# Altium schematic symbol library MiscPower.SchLib: 1552 symbols (part 12 of 22) (continued)
## LM5050MKX-2/NOPB (continued)
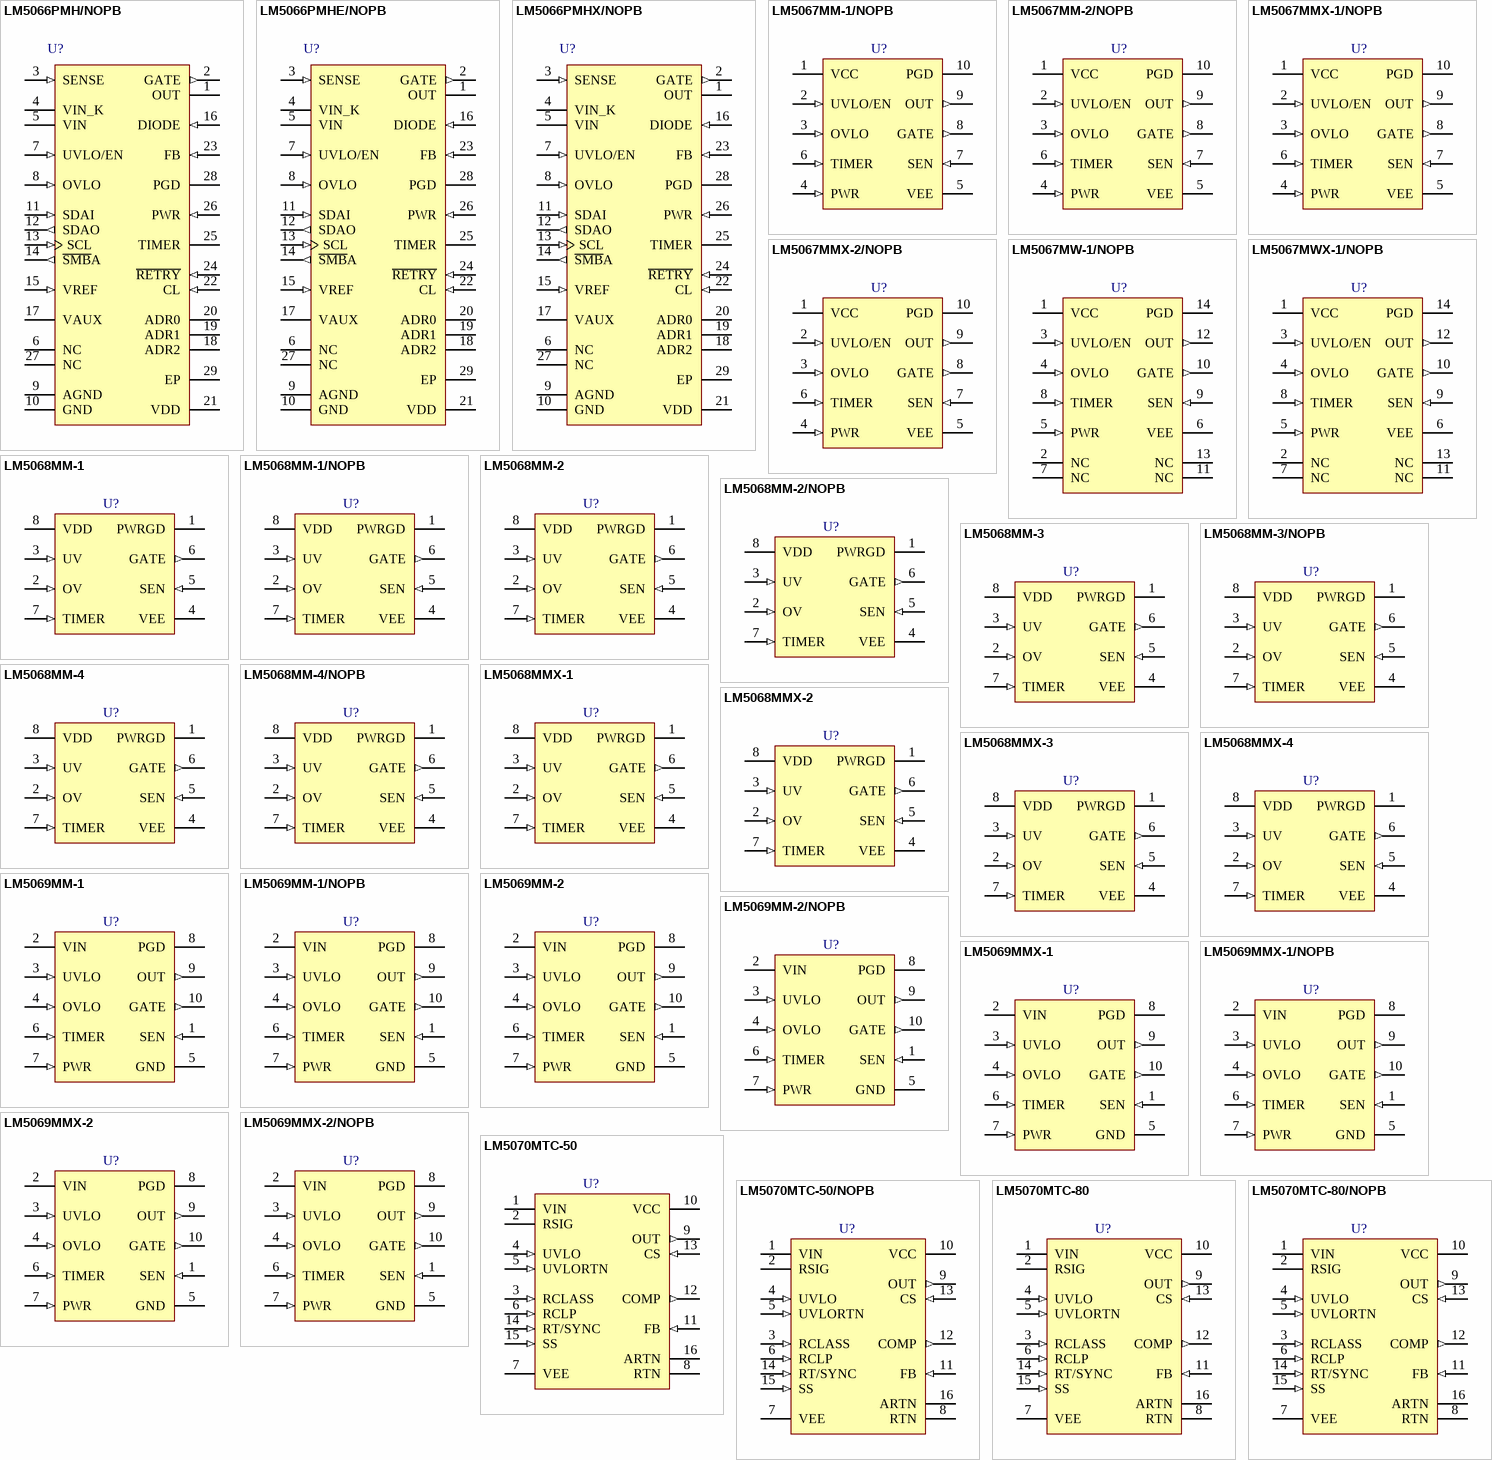
[diagram p27: symbols LM5066PMH/NOPB to LM5070MTC-80/NOPB]

## LM5066PMH/NOPB
designator U?
High Voltage System Power Management and Protection IC with PMBus, 28-pin TSSOP-EP, 48 Rail; PartNumber: LM5066PMH/NOPB; Manufacturer: National Semiconductor; PackageTopMarking: NSUZXYTTE#*LM5066PMH; PowerWise: Y; CompType: MiscPower; DatasheetVersion: Aug-2011; PackageVersion: revD, Oct-2003; PackageReference: MXA28A; PackageDescription: Molded TSSOP, Jedec, 9.7 x 4.4 x 0.9mm Body, 28 Lead, 0.65mm Pitch, Exposed Pad; RoHS: Y; PinCount: 28; High-Reliability: Y; Code_JEDEC: MO-153-AET; ComponentLink1Description: Manufacturer URL; ComponentLink1URL: http://www.national.com/; ComponentLink2Description: LM5066 Datasheet; ComponentLink2URL: http://www.national.com/ds/LM/LM5066.pdf; ComponentLink3Description: LM5066 Web Page; ComponentLink3URL: http://www.national.com/pf/LM/LM5066.html; ComponentLink4Description: MXA28A Package Page; ComponentLink4URL: http://www.national.com/packaging/folders/mxa28a.html
footprint MXA28A_N (TSOP, 28-Leads, Body 9.7x4.4mm, Pitch 0.65mm, Thermal Pad, IPC Medium Density)
footprint MXA28A_L (TSOP, 28-Leads, Body 9.7x4.4mm, Pitch 0.65mm, Thermal Pad, IPC High Density)
footprint MXA28A_M (TSOP, 28-Leads, Body 9.7x4.4mm, Pitch 0.65mm, Thermal Pad, IPC Low Density)
pins: 1 OUT (power), 2 GATE (out), 3 SENSE (in), 4 VIN_K (power), 5 VIN (power), 6 NC, 7 UVLO/EN (in), 8 OVLO (in), 9 AGND (power), 10 GND (power), 11 SDAI (in), 12 SDAO (out), 13 SCL (in), 14 ~{SMB}A (out), 15 VREF (in), 16 DIODE (in), 17 VAUX (power), 18 ADR2, 19 ADR1, 20 ADR0, 21 VDD (power), 22 CL (in), 23 FB (in), 24 ~{RETRY} (in), 25 TIMER, 26 PWR (in), 27 NC, 28 PGD (hiz), 29 EP (power)

## LM5066PMHE/NOPB
designator U?
High Voltage System Power Management and Protection IC with PMBus, 28-pin TSSOP-EP, 250 Reel; PartNumber: LM5066PMHE/NOPB; Manufacturer: National Semiconductor; PackageTopMarking: NSUZXYTTE#*LM5066PMH; PowerWise: Y; CompType: MiscPower; DatasheetVersion: Aug-2011; PackageVersion: revD, Oct-2003; PackageReference: MXA28A; PackageDescription: Molded TSSOP, Jedec, 9.7 x 4.4 x 0.9mm Body, 28 Lead, 0.65mm Pitch, Exposed Pad; RoHS: Y; PinCount: 28; High-Reliability: Y; Code_JEDEC: MO-153-AET; ComponentLink1Description: Manufacturer URL; ComponentLink1URL: http://www.national.com/; ComponentLink2Description: LM5066 Datasheet; ComponentLink2URL: http://www.national.com/ds/LM/LM5066.pdf; ComponentLink3Description: LM5066 Web Page; ComponentLink3URL: http://www.national.com/pf/LM/LM5066.html; ComponentLink4Description: MXA28A Package Page; ComponentLink4URL: http://www.national.com/packaging/folders/mxa28a.html
footprint MXA28A_N (TSOP, 28-Leads, Body 9.7x4.4mm, Pitch 0.65mm, Thermal Pad, IPC Medium Density)
footprint MXA28A_L (TSOP, 28-Leads, Body 9.7x4.4mm, Pitch 0.65mm, Thermal Pad, IPC High Density)
footprint MXA28A_M (TSOP, 28-Leads, Body 9.7x4.4mm, Pitch 0.65mm, Thermal Pad, IPC Low Density)
pins: 1 OUT (power), 2 GATE (out), 3 SENSE (in), 4 VIN_K (power), 5 VIN (power), 6 NC, 7 UVLO/EN (in), 8 OVLO (in), 9 AGND (power), 10 GND (power), 11 SDAI (in), 12 SDAO (out), 13 SCL (in), 14 ~{SMB}A (out), 15 VREF (in), 16 DIODE (in), 17 VAUX (power), 18 ADR2, 19 ADR1, 20 ADR0, 21 VDD (power), 22 CL (in), 23 FB (in), 24 ~{RETRY} (in), 25 TIMER, 26 PWR (in), 27 NC, 28 PGD (hiz), 29 EP (power)

## LM5066PMHX/NOPB
designator U?
High Voltage System Power Management and Protection IC with PMBus, 28-pin TSSOP-EP, 2500 Reel; PartNumber: LM5066PMHX/NOPB; Manufacturer: National Semiconductor; PackageTopMarking: NSUZXYTTE#*LM5066PMH; PowerWise: Y; CompType: MiscPower; DatasheetVersion: Aug-2011; PackageVersion: revD, Oct-2003; PackageReference: MXA28A; PackageDescription: Molded TSSOP, Jedec, 9.7 x 4.4 x 0.9mm Body, 28 Lead, 0.65mm Pitch, Exposed Pad; RoHS: Y; PinCount: 28; High-Reliability: Y; Code_JEDEC: MO-153-AET; ComponentLink1Description: Manufacturer URL; ComponentLink1URL: http://www.national.com/; ComponentLink2Description: LM5066 Datasheet; ComponentLink2URL: http://www.national.com/ds/LM/LM5066.pdf; ComponentLink3Description: LM5066 Web Page; ComponentLink3URL: http://www.national.com/pf/LM/LM5066.html; ComponentLink4Description: MXA28A Package Page; ComponentLink4URL: http://www.national.com/packaging/folders/mxa28a.html
footprint MXA28A_N (TSOP, 28-Leads, Body 9.7x4.4mm, Pitch 0.65mm, Thermal Pad, IPC Medium Density)
footprint MXA28A_L (TSOP, 28-Leads, Body 9.7x4.4mm, Pitch 0.65mm, Thermal Pad, IPC High Density)
footprint MXA28A_M (TSOP, 28-Leads, Body 9.7x4.4mm, Pitch 0.65mm, Thermal Pad, IPC Low Density)
pins: 1 OUT (power), 2 GATE (out), 3 SENSE (in), 4 VIN_K (power), 5 VIN (power), 6 NC, 7 UVLO/EN (in), 8 OVLO (in), 9 AGND (power), 10 GND (power), 11 SDAI (in), 12 SDAO (out), 13 SCL (in), 14 ~{SMB}A (out), 15 VREF (in), 16 DIODE (in), 17 VAUX (power), 18 ADR2, 19 ADR1, 20 ADR0, 21 VDD (power), 22 CL (in), 23 FB (in), 24 ~{RETRY} (in), 25 TIMER, 26 PWR (in), 27 NC, 28 PGD (hiz), 29 EP (power)

## LM5067MM-1/NOPB
designator U?
Negative Hot Swap / Inrush Current Controller with Power Limiting, 10-pin MSOP, Pb-Free; PartNumber: LM5067MM-1/NOPB; Manufacturer: National Semiconductor; PackageTopMarking: ZXTT*SRUB; PowerWise: N; CompType: MiscPower; High-Reliability: Y; DatasheetVersion: Sep-2009; PackageVersion: revB, Jul-2003; PackageReference: MUB10A; PackageDescription: Mini-SO, Molded, .118 x .118 x .034in Body, 10 Lead, .0197in Pitch; RoHS: Y; PinCount: 10; Code_JEDEC: MO-187-BA; ComponentLink1Description: Manufacturer URL; ComponentLink1URL: http://www.national.com/; ComponentLink2Description: LM5067 Datasheet; ComponentLink2URL: http://www.national.com/ds/LM/LM5067.pdf; ComponentLink3Description: LM5067 Web Page; ComponentLink3URL: http://www.national.com/pf/LM/LM5067.html; ComponentLink4Description: MUB10A Package Page; ComponentLink4URL: http://www.national.com/packaging/folders/mub10a.html
footprint MUB10A_N (TSSOP, 10-Leads, Body 3x3mm, Pitch 0.5mm, IPC Medium Density)
footprint MUB10A_L (TSSOP, 10-Leads, Body 3x3mm, Pitch 0.5mm, IPC High Density)
footprint MUB10A_M (TSSOP, 10-Leads, Body 3x3mm, Pitch 0.5mm, IPC Low Density)
pins: 1 VCC (power), 2 UVLO/EN (in), 3 OVLO (in), 4 PWR (in), 5 VEE (power), 6 TIMER (in), 7 SEN (in), 8 GATE (out), 9 OUT (out), 10 PGD (oc)

## LM5067MM-2/NOPB
designator U?
Negative Hot Swap / Inrush Current Controller with Power Limiting, 10-pin MSOP, Pb-Free; PartNumber: LM5067MM-2/NOPB; Manufacturer: National Semiconductor; PackageTopMarking: ZXTT*SRVB; PowerWise: N; CompType: MiscPower; High-Reliability: Y; DatasheetVersion: Sep-2009; PackageVersion: revB, Jul-2003; PackageReference: MUB10A; PackageDescription: Mini-SO, Molded, .118 x .118 x .034in Body, 10 Lead, .0197in Pitch; RoHS: Y; PinCount: 10; Code_JEDEC: MO-187-BA; ComponentLink1Description: Manufacturer URL; ComponentLink1URL: http://www.national.com/; ComponentLink2Description: LM5067 Datasheet; ComponentLink2URL: http://www.national.com/ds/LM/LM5067.pdf; ComponentLink3Description: LM5067 Web Page; ComponentLink3URL: http://www.national.com/pf/LM/LM5067.html; ComponentLink4Description: MUB10A Package Page; ComponentLink4URL: http://www.national.com/packaging/folders/mub10a.html
footprint MUB10A_N (TSSOP, 10-Leads, Body 3x3mm, Pitch 0.5mm, IPC Medium Density)
footprint MUB10A_L (TSSOP, 10-Leads, Body 3x3mm, Pitch 0.5mm, IPC High Density)
footprint MUB10A_M (TSSOP, 10-Leads, Body 3x3mm, Pitch 0.5mm, IPC Low Density)
pins: 1 VCC (power), 2 UVLO/EN (in), 3 OVLO (in), 4 PWR (in), 5 VEE (power), 6 TIMER (in), 7 SEN (in), 8 GATE (out), 9 OUT (out), 10 PGD (oc)

## LM5067MMX-1/NOPB
designator U?
Negative Hot Swap / Inrush Current Controller with Power Limiting, 10-pin MSOP, Pb-Free; PartNumber: LM5067MMX-1/NOPB; Manufacturer: National Semiconductor; PackageTopMarking: ZXTT*SRUB; PowerWise: N; CompType: MiscPower; High-Reliability: Y; DatasheetVersion: Sep-2009; PackageVersion: revB, Jul-2003; PackageReference: MUB10A; PackageDescription: Mini-SO, Molded, .118 x .118 x .034in Body, 10 Lead, .0197in Pitch; RoHS: Y; PinCount: 10; Code_JEDEC: MO-187-BA; ComponentLink1Description: Manufacturer URL; ComponentLink1URL: http://www.national.com/; ComponentLink2Description: LM5067 Datasheet; ComponentLink2URL: http://www.national.com/ds/LM/LM5067.pdf; ComponentLink3Description: LM5067 Web Page; ComponentLink3URL: http://www.national.com/pf/LM/LM5067.html; ComponentLink4Description: MUB10A Package Page; ComponentLink4URL: http://www.national.com/packaging/folders/mub10a.html
footprint MUB10A_N (TSSOP, 10-Leads, Body 3x3mm, Pitch 0.5mm, IPC Medium Density)
footprint MUB10A_L (TSSOP, 10-Leads, Body 3x3mm, Pitch 0.5mm, IPC High Density)
footprint MUB10A_M (TSSOP, 10-Leads, Body 3x3mm, Pitch 0.5mm, IPC Low Density)
pins: 1 VCC (power), 2 UVLO/EN (in), 3 OVLO (in), 4 PWR (in), 5 VEE (power), 6 TIMER (in), 7 SEN (in), 8 GATE (out), 9 OUT (out), 10 PGD (oc)

## LM5067MMX-2/NOPB
designator U?
Negative Hot Swap / Inrush Current Controller with Power Limiting, 10-pin MSOP, Pb-Free; PartNumber: LM5067MMX-2/NOPB; Manufacturer: National Semiconductor; PackageTopMarking: ZXTT*SRVB; PowerWise: N; CompType: MiscPower; High-Reliability: Y; DatasheetVersion: Sep-2009; PackageVersion: revB, Jul-2003; PackageReference: MUB10A; PackageDescription: Mini-SO, Molded, .118 x .118 x .034in Body, 10 Lead, .0197in Pitch; RoHS: Y; PinCount: 10; Code_JEDEC: MO-187-BA; ComponentLink1Description: Manufacturer URL; ComponentLink1URL: http://www.national.com/; ComponentLink2Description: LM5067 Datasheet; ComponentLink2URL: http://www.national.com/ds/LM/LM5067.pdf; ComponentLink3Description: LM5067 Web Page; ComponentLink3URL: http://www.national.com/pf/LM/LM5067.html; ComponentLink4Description: MUB10A Package Page; ComponentLink4URL: http://www.national.com/packaging/folders/mub10a.html
footprint MUB10A_N (TSSOP, 10-Leads, Body 3x3mm, Pitch 0.5mm, IPC Medium Density)
footprint MUB10A_L (TSSOP, 10-Leads, Body 3x3mm, Pitch 0.5mm, IPC High Density)
footprint MUB10A_M (TSSOP, 10-Leads, Body 3x3mm, Pitch 0.5mm, IPC Low Density)
pins: 1 VCC (power), 2 UVLO/EN (in), 3 OVLO (in), 4 PWR (in), 5 VEE (power), 6 TIMER (in), 7 SEN (in), 8 GATE (out), 9 OUT (out), 10 PGD (oc)

## LM5067MW-1/NOPB
designator U?
Negative Hot Swap / Inrush Current Controller with Power Limiting, 14-pin Wide SOIC, Pb-Free; PartNumber: LM5067MW-1/NOPB; Manufacturer: National Semiconductor; PackageTopMarking: NSUZXYTTE#*LM5067*MW-1; PowerWise: N; CompType: MiscPower; High-Reliability: Y; DatasheetVersion: Sep-2009; PackageVersion: revD, Feb-1987; PackageReference: M14B; PackageDescription: Molded Package, S.O., .300in Wide, 14 Lead; RoHS: Y; PinCount: 14; Code_JEDEC: MS-013-AF; Code_IPC: SOIC127P1030-14; ComponentLink1Description: Manufacturer URL; ComponentLink1URL: http://www.national.com/; ComponentLink2Description: LM5067 Datasheet; ComponentLink2URL: http://www.national.com/ds/LM/LM5067.pdf; ComponentLink3Description: LM5067 Web Page; ComponentLink3URL: http://www.national.com/pf/LM/LM5067.html; ComponentLink4Description: M14B Package Page; ComponentLink4URL: http://www.national.com/packaging/folders/m14b.html
footprint M14B_N (SOIC, 14-Leads, Body 9x7.5mm, Pitch 1.27mm, IPC Medium Density)
footprint M14B_L (SOIC, 14-Leads, Body 9x7.5mm, Pitch 1.27mm, IPC High Density)
footprint M14B_M (SOIC, 14-Leads, Body 9x7.5mm, Pitch 1.27mm, IPC Low Density)
pins: 1 VCC (power), 2 NC, 3 UVLO/EN (in), 4 OVLO (in), 5 PWR (in), 6 VEE (power), 7 NC, 8 TIMER (in), 9 SEN (in), 10 GATE (out), 11 NC, 12 OUT (out), 13 NC, 14 PGD (oc)

## LM5067MWX-1/NOPB
designator U?
Negative Hot Swap / Inrush Current Controller with Power Limiting, 14-pin Wide SOIC, Pb-Free; PartNumber: LM5067MWX-1/NOPB; Manufacturer: National Semiconductor; PackageTopMarking: NSUZXYTTE#*LM5067*MW-1; PowerWise: N; CompType: MiscPower; High-Reliability: Y; DatasheetVersion: Sep-2009; PackageVersion: revD, Feb-1987; PackageReference: M14B; PackageDescription: Molded Package, S.O., .300in Wide, 14 Lead; RoHS: Y; PinCount: 14; Code_JEDEC: MS-013-AF; Code_IPC: SOIC127P1030-14; ComponentLink1Description: Manufacturer URL; ComponentLink1URL: http://www.national.com/; ComponentLink2Description: LM5067 Datasheet; ComponentLink2URL: http://www.national.com/ds/LM/LM5067.pdf; ComponentLink3Description: LM5067 Web Page; ComponentLink3URL: http://www.national.com/pf/LM/LM5067.html; ComponentLink4Description: M14B Package Page; ComponentLink4URL: http://www.national.com/packaging/folders/m14b.html
footprint M14B_N (SOIC, 14-Leads, Body 9x7.5mm, Pitch 1.27mm, IPC Medium Density)
footprint M14B_L (SOIC, 14-Leads, Body 9x7.5mm, Pitch 1.27mm, IPC High Density)
footprint M14B_M (SOIC, 14-Leads, Body 9x7.5mm, Pitch 1.27mm, IPC Low Density)
pins: 1 VCC (power), 2 NC, 3 UVLO/EN (in), 4 OVLO (in), 5 PWR (in), 6 VEE (power), 7 NC, 8 TIMER (in), 9 SEN (in), 10 GATE (out), 11 NC, 12 OUT (out), 13 NC, 14 PGD (oc)

## LM5068MM-1
designator U?
Negative Voltage Hot Swap Controller, 8-pin MSOP; PartNumber: LM5068MM-1; Manufacturer: National Semiconductor; PackageTopMarking: ZXTT*S66B; PowerWise: N; CompType: MiscPower; High-Reliability: Y; DatasheetVersion: Dec-2004; PackageVersion: revF, Apr-2008; PackageReference: MUA08A; PackageDescription: MINI SOIC, .118 x .118 x .034in, 8 Lead, .0256in Pitch; RoHS: N; PinCount: 8; Code_JEDEC: MO-187-AA; ComponentLink1Description: Manufacturer URL; ComponentLink1URL: http://www.national.com/; ComponentLink2Description: LM5068 Datasheet; ComponentLink2URL: http://www.national.com/ds/LM/LM5068.pdf; ComponentLink3Description: LM5068 Web Page; ComponentLink3URL: http://www.national.com/pf/LM/LM5068.html; ComponentLink4Description: MUA08A Package Page; ComponentLink4URL: http://www.national.com/packaging/folders/mua08a.html
footprint MUA08A_N (TSOP, 8-Leads, Body 3x3mm, Pitch 0.65mm, IPC Medium Density)
footprint MUA08A_L (TSOP, 8-Leads, Body 3x3mm, Pitch 0.65mm, IPC High Density)
footprint MUA08A_M (TSOP, 8-Leads, Body 3x3mm, Pitch 0.65mm, IPC Low Density)
pins: 1 PWRGD (oc), 2 OV (in), 3 UV (in), 4 VEE (power), 5 SEN (in), 6 GATE (out), 7 TIMER (in), 8 VDD (power)

## LM5068MM-1/NOPB
designator U?
Negative Voltage Hot Swap Controller, 8-pin MSOP, Pb-Free; PartNumber: LM5068MM-1/NOPB; Manufacturer: National Semiconductor; PackageTopMarking: ZXTT*S66B; PowerWise: N; CompType: MiscPower; High-Reliability: Y; DatasheetVersion: Dec-2004; PackageVersion: revF, Apr-2008; PackageReference: MUA08A; PackageDescription: MINI SOIC, .118 x .118 x .034in, 8 Lead, .0256in Pitch; RoHS: Y; PinCount: 8; Code_JEDEC: MO-187-AA; ComponentLink1Description: Manufacturer URL; ComponentLink1URL: http://www.national.com/; ComponentLink2Description: LM5068 Datasheet; ComponentLink2URL: http://www.national.com/ds/LM/LM5068.pdf; ComponentLink3Description: LM5068 Web Page; ComponentLink3URL: http://www.national.com/pf/LM/LM5068.html; ComponentLink4Description: MUA08A Package Page; ComponentLink4URL: http://www.national.com/packaging/folders/mua08a.html
footprint MUA08A_N (TSOP, 8-Leads, Body 3x3mm, Pitch 0.65mm, IPC Medium Density)
footprint MUA08A_L (TSOP, 8-Leads, Body 3x3mm, Pitch 0.65mm, IPC High Density)
footprint MUA08A_M (TSOP, 8-Leads, Body 3x3mm, Pitch 0.65mm, IPC Low Density)
pins: 1 PWRGD (oc), 2 OV (in), 3 UV (in), 4 VEE (power), 5 SEN (in), 6 GATE (out), 7 TIMER (in), 8 VDD (power)

## LM5068MM-2
designator U?
Negative Voltage Hot Swap Controller, 8-pin MSOP; PartNumber: LM5068MM-2; Manufacturer: National Semiconductor; PackageTopMarking: ZXTT*S67B; PowerWise: N; CompType: MiscPower; High-Reliability: Y; DatasheetVersion: Dec-2004; PackageVersion: revF, Apr-2008; PackageReference: MUA08A; PackageDescription: MINI SOIC, .118 x .118 x .034in, 8 Lead, .0256in Pitch; RoHS: N; PinCount: 8; Code_JEDEC: MO-187-AA; ComponentLink1Description: Manufacturer URL; ComponentLink1URL: http://www.national.com/; ComponentLink2Description: LM5068 Datasheet; ComponentLink2URL: http://www.national.com/ds/LM/LM5068.pdf; ComponentLink3Description: LM5068 Web Page; ComponentLink3URL: http://www.national.com/pf/LM/LM5068.html; ComponentLink4Description: MUA08A Package Page; ComponentLink4URL: http://www.national.com/packaging/folders/mua08a.html
footprint MUA08A_N (TSOP, 8-Leads, Body 3x3mm, Pitch 0.65mm, IPC Medium Density)
footprint MUA08A_L (TSOP, 8-Leads, Body 3x3mm, Pitch 0.65mm, IPC High Density)
footprint MUA08A_M (TSOP, 8-Leads, Body 3x3mm, Pitch 0.65mm, IPC Low Density)
pins: 1 PWRGD (oc), 2 OV (in), 3 UV (in), 4 VEE (power), 5 SEN (in), 6 GATE (out), 7 TIMER (in), 8 VDD (power)

## LM5068MM-2/NOPB
designator U?
Negative Voltage Hot Swap Controller, 8-pin MSOP, Pb-Free; PartNumber: LM5068MM-2/NOPB; Manufacturer: National Semiconductor; PackageTopMarking: ZXTT*S67B; PowerWise: N; CompType: MiscPower; High-Reliability: Y; DatasheetVersion: Dec-2004; PackageVersion: revF, Apr-2008; PackageReference: MUA08A; PackageDescription: MINI SOIC, .118 x .118 x .034in, 8 Lead, .0256in Pitch; RoHS: Y; PinCount: 8; Code_JEDEC: MO-187-AA; ComponentLink1Description: Manufacturer URL; ComponentLink1URL: http://www.national.com/; ComponentLink2Description: LM5068 Datasheet; ComponentLink2URL: http://www.national.com/ds/LM/LM5068.pdf; ComponentLink3Description: LM5068 Web Page; ComponentLink3URL: http://www.national.com/pf/LM/LM5068.html; ComponentLink4Description: MUA08A Package Page; ComponentLink4URL: http://www.national.com/packaging/folders/mua08a.html
footprint MUA08A_N (TSOP, 8-Leads, Body 3x3mm, Pitch 0.65mm, IPC Medium Density)
footprint MUA08A_L (TSOP, 8-Leads, Body 3x3mm, Pitch 0.65mm, IPC High Density)
footprint MUA08A_M (TSOP, 8-Leads, Body 3x3mm, Pitch 0.65mm, IPC Low Density)
pins: 1 PWRGD (oc), 2 OV (in), 3 UV (in), 4 VEE (power), 5 SEN (in), 6 GATE (out), 7 TIMER (in), 8 VDD (power)

## LM5068MM-3
designator U?
Negative Voltage Hot Swap Controller, 8-pin MSOP; PartNumber: LM5068MM-3; Manufacturer: National Semiconductor; PackageTopMarking: ZXTT*S68B; PowerWise: N; CompType: MiscPower; High-Reliability: Y; DatasheetVersion: Dec-2004; PackageVersion: revF, Apr-2008; PackageReference: MUA08A; PackageDescription: MINI SOIC, .118 x .118 x .034in, 8 Lead, .0256in Pitch; RoHS: N; PinCount: 8; Code_JEDEC: MO-187-AA; ComponentLink1Description: Manufacturer URL; ComponentLink1URL: http://www.national.com/; ComponentLink2Description: LM5068 Datasheet; ComponentLink2URL: http://www.national.com/ds/LM/LM5068.pdf; ComponentLink3Description: LM5068 Web Page; ComponentLink3URL: http://www.national.com/pf/LM/LM5068.html; ComponentLink4Description: MUA08A Package Page; ComponentLink4URL: http://www.national.com/packaging/folders/mua08a.html
footprint MUA08A_N (TSOP, 8-Leads, Body 3x3mm, Pitch 0.65mm, IPC Medium Density)
footprint MUA08A_L (TSOP, 8-Leads, Body 3x3mm, Pitch 0.65mm, IPC High Density)
footprint MUA08A_M (TSOP, 8-Leads, Body 3x3mm, Pitch 0.65mm, IPC Low Density)
pins: 1 PWRGD (oc), 2 OV (in), 3 UV (in), 4 VEE (power), 5 SEN (in), 6 GATE (out), 7 TIMER (in), 8 VDD (power)

## LM5068MM-3/NOPB
designator U?
Negative Voltage Hot Swap Controller, 8-pin MSOP, Pb-Free; PartNumber: LM5068MM-3/NOPB; Manufacturer: National Semiconductor; PackageTopMarking: ZXTT*S68B; PowerWise: N; CompType: MiscPower; High-Reliability: Y; DatasheetVersion: Dec-2004; PackageVersion: revF, Apr-2008; PackageReference: MUA08A; PackageDescription: MINI SOIC, .118 x .118 x .034in, 8 Lead, .0256in Pitch; RoHS: Y; PinCount: 8; Code_JEDEC: MO-187-AA; ComponentLink1Description: Manufacturer URL; ComponentLink1URL: http://www.national.com/; ComponentLink2Description: LM5068 Datasheet; ComponentLink2URL: http://www.national.com/ds/LM/LM5068.pdf; ComponentLink3Description: LM5068 Web Page; ComponentLink3URL: http://www.national.com/pf/LM/LM5068.html; ComponentLink4Description: MUA08A Package Page; ComponentLink4URL: http://www.national.com/packaging/folders/mua08a.html
footprint MUA08A_N (TSOP, 8-Leads, Body 3x3mm, Pitch 0.65mm, IPC Medium Density)
footprint MUA08A_L (TSOP, 8-Leads, Body 3x3mm, Pitch 0.65mm, IPC High Density)
footprint MUA08A_M (TSOP, 8-Leads, Body 3x3mm, Pitch 0.65mm, IPC Low Density)
pins: 1 PWRGD (oc), 2 OV (in), 3 UV (in), 4 VEE (power), 5 SEN (in), 6 GATE (out), 7 TIMER (in), 8 VDD (power)

## LM5068MM-4
designator U?
Negative Voltage Hot Swap Controller, 8-pin MSOP; PartNumber: LM5068MM-4; Manufacturer: National Semiconductor; PackageTopMarking: ZXTT*S69B; PowerWise: N; CompType: MiscPower; High-Reliability: Y; DatasheetVersion: Dec-2004; PackageVersion: revF, Apr-2008; PackageReference: MUA08A; PackageDescription: MINI SOIC, .118 x .118 x .034in, 8 Lead, .0256in Pitch; RoHS: N; PinCount: 8; Code_JEDEC: MO-187-AA; ComponentLink1Description: Manufacturer URL; ComponentLink1URL: http://www.national.com/; ComponentLink2Description: LM5068 Datasheet; ComponentLink2URL: http://www.national.com/ds/LM/LM5068.pdf; ComponentLink3Description: LM5068 Web Page; ComponentLink3URL: http://www.national.com/pf/LM/LM5068.html; ComponentLink4Description: MUA08A Package Page; ComponentLink4URL: http://www.national.com/packaging/folders/mua08a.html
footprint MUA08A_N (TSOP, 8-Leads, Body 3x3mm, Pitch 0.65mm, IPC Medium Density)
footprint MUA08A_L (TSOP, 8-Leads, Body 3x3mm, Pitch 0.65mm, IPC High Density)
footprint MUA08A_M (TSOP, 8-Leads, Body 3x3mm, Pitch 0.65mm, IPC Low Density)
pins: 1 PWRGD (oc), 2 OV (in), 3 UV (in), 4 VEE (power), 5 SEN (in), 6 GATE (out), 7 TIMER (in), 8 VDD (power)

## LM5068MM-4/NOPB
designator U?
Negative Voltage Hot Swap Controller, 8-pin MSOP, Pb-Free; PartNumber: LM5068MM-4/NOPB; Manufacturer: National Semiconductor; PackageTopMarking: ZXTT*S69B; PowerWise: N; CompType: MiscPower; High-Reliability: Y; DatasheetVersion: Dec-2004; PackageVersion: revF, Apr-2008; PackageReference: MUA08A; PackageDescription: MINI SOIC, .118 x .118 x .034in, 8 Lead, .0256in Pitch; RoHS: Y; PinCount: 8; Code_JEDEC: MO-187-AA; ComponentLink1Description: Manufacturer URL; ComponentLink1URL: http://www.national.com/; ComponentLink2Description: LM5068 Datasheet; ComponentLink2URL: http://www.national.com/ds/LM/LM5068.pdf; ComponentLink3Description: LM5068 Web Page; ComponentLink3URL: http://www.national.com/pf/LM/LM5068.html; ComponentLink4Description: MUA08A Package Page; ComponentLink4URL: http://www.national.com/packaging/folders/mua08a.html
footprint MUA08A_N (TSOP, 8-Leads, Body 3x3mm, Pitch 0.65mm, IPC Medium Density)
footprint MUA08A_L (TSOP, 8-Leads, Body 3x3mm, Pitch 0.65mm, IPC High Density)
footprint MUA08A_M (TSOP, 8-Leads, Body 3x3mm, Pitch 0.65mm, IPC Low Density)
pins: 1 PWRGD (oc), 2 OV (in), 3 UV (in), 4 VEE (power), 5 SEN (in), 6 GATE (out), 7 TIMER (in), 8 VDD (power)

## LM5068MMX-1
designator U?
Negative Voltage Hot Swap Controller, 8-pin MSOP; PartNumber: LM5068MMX-1; Manufacturer: National Semiconductor; PackageTopMarking: ZXTT*S66B; PowerWise: N; CompType: MiscPower; High-Reliability: Y; DatasheetVersion: Dec-2004; PackageVersion: revF, Apr-2008; PackageReference: MUA08A; PackageDescription: MINI SOIC, .118 x .118 x .034in, 8 Lead, .0256in Pitch; RoHS: N; PinCount: 8; Code_JEDEC: MO-187-AA; ComponentLink1Description: Manufacturer URL; ComponentLink1URL: http://www.national.com/; ComponentLink2Description: LM5068 Datasheet; ComponentLink2URL: http://www.national.com/ds/LM/LM5068.pdf; ComponentLink3Description: LM5068 Web Page; ComponentLink3URL: http://www.national.com/pf/LM/LM5068.html; ComponentLink4Description: MUA08A Package Page; ComponentLink4URL: http://www.national.com/packaging/folders/mua08a.html
footprint MUA08A_N (TSOP, 8-Leads, Body 3x3mm, Pitch 0.65mm, IPC Medium Density)
footprint MUA08A_L (TSOP, 8-Leads, Body 3x3mm, Pitch 0.65mm, IPC High Density)
footprint MUA08A_M (TSOP, 8-Leads, Body 3x3mm, Pitch 0.65mm, IPC Low Density)
pins: 1 PWRGD (oc), 2 OV (in), 3 UV (in), 4 VEE (power), 5 SEN (in), 6 GATE (out), 7 TIMER (in), 8 VDD (power)
